# Altium integrated library PAT_Library.IntLib: 45 symbols (part 1 of 2)
Pins are listed as number, name and electrical type; pins without a type are passive.

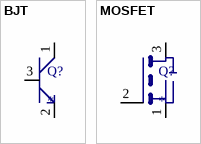
[diagram p0: symbols BJT to MOSFET]

## BJT
designator Q?
Transistor BJT; Digi-Key Part Number: MMBT2222A-FDICT-ND
footprint BJT
pins: 1, 2, 3

## MOSFET
designator Q?
Transistor FET; Digi-Key Part Number: BSS123NCT-ND
footprint MOSFET
pins: 1 G, 2 S, 3 D


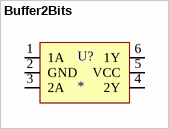
[diagram p1: symbol Buffer2Bits]

## Buffer2Bits
designator U?
Buffer 2Bits; Digi-Key Part Number: *
footprint DCK R_PDSO-G6
pins: 1 1A, 2 GND, 3 2A, 4 2Y, 5 VCC, 6 1Y


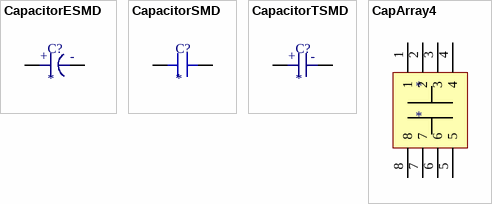
[diagram p2: symbols CapacitorESMD to CapArray4]

## CapacitorESMD
designator C?
Electrolitic Capacitor
footprint CAPACITORE0805
footprint CAPACITORE1206
footprint RadialSMD6.3 (SMD Type Radial)
footprint RADIALSMD4.0
pins: 1, 2
text: +; -

## CapacitorSMD
designator C?
Ceramic Capacitor
footprint Capacitor1206
footprint Capacitor0805
pins: 1, 2

## CapacitorTSMD
designator C?
Tantalum Capacitor; Digi-Key PArt Number: *
footprint CAPACITORT1210 (Tantalum Capacitor 1210)
pins: 1, 2
text: +; -

## CapArray4
designator *
Capacitor Network, 4 Isolated
footprint C_array
pins: 1, 2, 3, 4, 5, 6, 7, 8


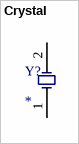
[diagram p3: symbol Crystal]

## Crystal
designator Y?
Crystal SMD
footprint CrystalSMD
footprint CRYSTALSMDMini
footprint CRYSTALTHR (Crystal Thru - Hole)
pins: 1, 2


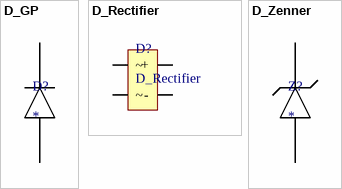
[diagram p4: symbols D_GP to D_Zenner]

## D_GP
designator D?
Single Diode Rectifier SMD
footprint SMA (Diode SMA)
footprint DIODO
footprint SMB (Diode SMB)
footprint SOD80
pins: 1, 2

## D_Rectifier
designator D?
Full bridge Rectifier; Digi-Key Part Number: DF04SCT-ND
footprint SDIP4
pins: 1 +, 2 -, 3 ~, 4 ~

## D_Zenner
designator Z?
Diode Zenner Type SMB
footprint SMB
footprint SOD123
pins: 1, 2


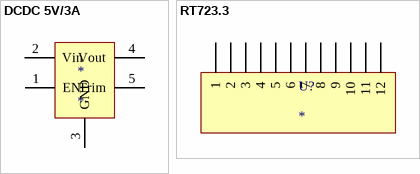
[diagram p5: symbols DCDC 5V/3A to RT723.3]

## DCDC 5V/3A
designator *
footprint OKR
pins: 1 EN, 2 Vin, 3 GND, 4 Vout, 5 Trim

## RT723.3
designator U?
Conversor DC/DC salida 3.3V
footprint R-723.3P
pins: 1, 2, 3, 4, 5, 6, 7, 8, 9, 10, 11, 12


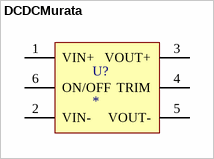
[diagram p6: symbol DCDCMurata]

## DCDCMurata
designator U?
Converter DC-DC Murata, high current; Digi-Key Part Number: 811-3139-1-ND
footprint DCDCMurata
pins: 1 VIN+, 2 VIN-, 3 VOUT+, 4 TRIM, 5 VOUT-, 6 ON/OFF


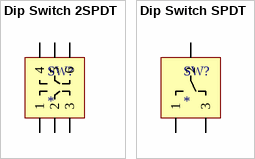
[diagram p7: symbols Dip Switch 2SPDT to Dip Switch SPDT]

## Dip Switch 2SPDT
designator SW?
Two SPDT switch; Digi-Key Part Number: CASD20GCT-ND
footprint DIPSWITCH2SPDT
pins: 1, 2, 3, 4, 5, 6

## Dip Switch SPDT
designator SW?
One SPDT switch; Digi-Key Part Number: 563-1024-1-ND
footprint DipSwitchSPDT
pins: 1, 2, 3


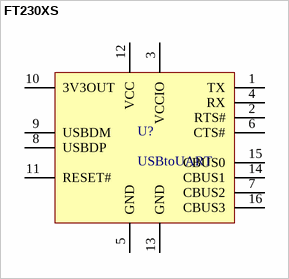
[diagram p8: symbol FT230XS]

## FT230XS
designator U?, comment USBtoUART
FTDI USB Serial Converter
footprint SSOP16
pins: 1 TX, 2 RTS#, 3 VCCIO, 4 RX, 5 GND, 6 CTS#, 7 CBUS2, 8 USBDP, 9 USBDM, 10 3V3OUT, 11 RESET#, 12 VCC, 13 GND, 14 CBUS1, 15 CBUS0, 16 CBUS3


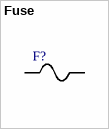
[diagram p9: symbol Fuse]

## Fuse
designator F?  (value not drawn)
Fuse 6x25mm; Digi-Key Part Number: 283-2601-ND; Digi-Key Part Number: 283-3410-ND
footprint FH_25mm (Para Fuse de 25mm y diam 6mm)
footprint FUSEBLOCKSMD (Fuse Block Cartridge SMD)
pins: 1, 2


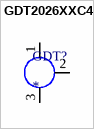
[diagram p10: symbol GDT2026XXC4]

## GDT2026XXC4
designator GDT?
Digi-Key Part Number: 2026-07-C4-ND
footprint GDT2026XXC4
pins: 1, 2, 3


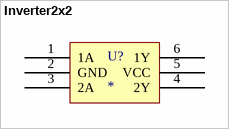
[diagram p11: symbol Inverter2x2]

## Inverter2x2
designator U?
Logic Inverter 2 Circuits; Digi-Key Part Number: 296-27361-1-ND
footprint Inverter2x2 (Inversor Lógico 2E2S)
pins: 1 1A, 2 GND, 3 2A, 4 2Y, 5 VCC, 6 1Y


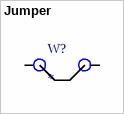
[diagram p12: symbol Jumper]

## Jumper
designator W?
Jumper
footprint Jumper
pins: 1, 2


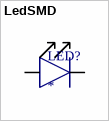
[diagram p13: symbol LedSMD]

## LedSMD
designator LED?
Discrete Led SMD 1205 Green; Digi-Key Part Number: 160-1169-1-ND
footprint SMD1206
pins: 1, 2


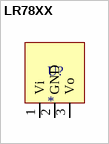
[diagram p14: symbol LR78XX]

## LR78XX
designator U?
Linear Regulator 78XX; Digi-Key Part Number: 497-1203-1-ND
footprint LR78XX (SMD)
footprint SOT223
pins: 1 Vi, 2 GND, 3 Vo


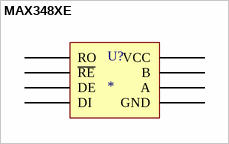
[diagram p15: symbol MAX348XE]

## MAX348XE
designator U?
Digi-Key Part Number: MAX3485ECSA+-ND
footprint MAX348XE
pins: 1 RO, 2 ~{RE}, 3 DE, 4 DI, 5 GND, 6 A, 7 B, 8 VCC


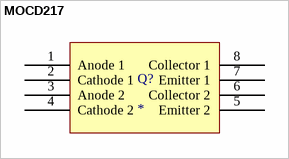
[diagram p16: symbol MOCD217]

## MOCD217
designator Q?
Optocoupler; Digi-Key Part Number: MOCD217R2MCT-ND
footprint SOIC8
pins: 1 Anode 1, 2 Cathode 1, 3 Anode 2, 4 Cathode 2, 5 Emitter 2, 6 Collector 2, 7 Emitter 1, 8 Collector 1


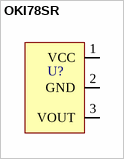
[diagram p17: symbol OKI78SR]

## OKI78SR
designator U?  (value not drawn)
Regulator DC-DC 3.3V 1.5A; Digi-Key Part Number: 811-2196-5-ND
footprint OKI78SR (Regulator DC-DC 3.3V 1.5A)
footprint OKI78SRE (DC-DC Converter Right-Angle)
pins: 1 VCC, 2 GND, 3 VOUT


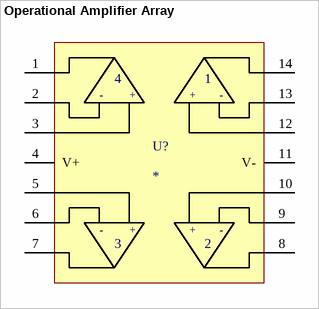
[diagram p18: symbol Operational Amplifier Array]

## Operational Amplifier Array
designator U?
Array Opam; Digi-Key Part Number: LMC660CMX/NOPBCT-ND
footprint Opam Array (Four Opam)
pins: 1, 2, 3, 4 V+, 5, 6, 7, 8, 9, 10, 11 V-, 12, 13, 14
text: -; +


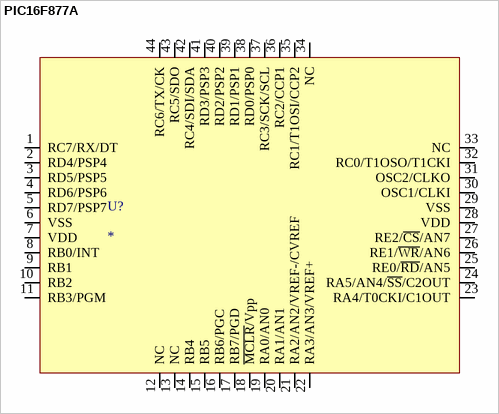
[diagram p19: symbol PIC16F877A]

## PIC16F877A
designator U?
Microcontroller PIC16F877A TQFP; Digi-Key Part Number: PIC16F877AT-I/PTCT-ND
footprint PIC16F877A (44Pin-TQFP)
pins: 1 RC7/RX/DT, 2 RD4/PSP4, 3 RD5/PSP5, 4 RD6/PSP6, 5 RD7/PSP7, 6 VSS, 7 VDD, 8 RB0/INT, 9 RB1, 10 RB2, 11 RB3/PGM, 12 NC, 13 NC, 14 RB4, 15 RB5, 16 RB6/PGC, 17 RB7/PGD, 18 ~{MCLR}/Vpp, 19 RA0/AN0, 20 RA1/AN1, 21 RA2/AN2/VREF-/CVREF, 22 RA3/AN3/VREF+, 23 RA4/T0CKI/C1OUT, 24 RA5/AN4/~{SS}/C2OUT, 25 RE0/~{RD}/AN5, 26 RE1/~{WR}/AN6, 27 RE2/~{CS}/AN7, 28 VDD, 29 VSS, 30 OSC1/CLKI, 31 OSC2/CLKO, 32 RC0/T1OSO/T1CKI, 33 NC, 34 NC, 35 RC1/T1OSI/CCP2, 36 RC2/CCP1, 37 RC3/SCK/SCL, 38 RD0/PSP0, 39 RD1/PSP1, 40 RD2/PSP2, 41 RD3/PSP3, 42 RC4/SDI/SDA, 43 RC5/SDO, 44 RC6/TX/CK


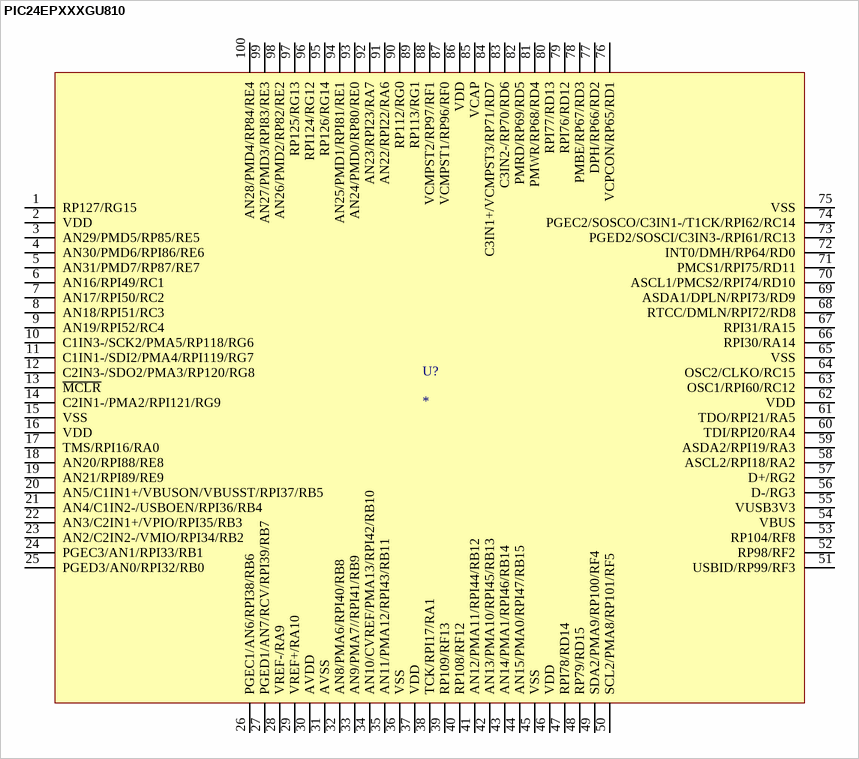
[diagram p20: symbol PIC24EPXXXGU810]

## PIC24EPXXXGU810
designator U?
Microcontroller MicroChip PIC24EP; Digi-Key Part Number: PIC24EP256GU810-I/PT-ND
footprint QFP100 (Microcontroller 12x12x1mm body, 2mm footprint)
pins: 1 RP127/RG15, 2 VDD, 3 AN29/PMD5/RP85/RE5, 4 AN30/PMD6/RPI86/RE6, 5 AN31/PMD7/RP87/RE7, 6 AN16/RPI49/RC1, 7 AN17/RPI50/RC2, 8 AN18/RPI51/RC3, 9 AN19/RPI52/RC4, 10 C1IN3-/SCK2/PMA5/RP118/RG6, 11 C1IN1-/SDI2/PMA4/RPI119/RG7, 12 C2IN3-/SDO2/PMA3/RP120/RG8, 13 ~{MCLR}, 14 C2IN1-/PMA2/RPI121/RG9, 15 VSS, 16 VDD, 17 TMS/RPI16/RA0, 18 AN20/RPI88/RE8, 19 AN21/RPI89/RE9, 20 AN5/C1IN1+/VBUSON/VBUSST/RPI37/RB5, 21 AN4/C1IN2-/USBOEN/RPI36/RB4, 22 AN3/C2IN1+/VPIO/RPI35/RB3, 23 AN2/C2IN2-/VMIO/RPI34/RB2, 24 PGEC3/AN1/RPI33/RB1, 25 PGED3/AN0/RPI32/RB0, 26 PGEC1/AN6/RPI38/RB6, 27 PGED1/AN7/RCV/RPI39/RB7, 28 VREF-/RA9, 29 VREF+/RA10, 30 AVDD, 31 AVSS, 32 AN8/PMA6/RPI40/RB8, 33 AN9/PMA7//RPI41/RB9, 34 AN10/CVREF/PMA13/RPI42/RB10, 35 AN11/PMA12/RPI43/RB11, 36 VSS, 37 VDD, 38 TCK/RPI17/RA1, 39 RP109/RF13, 40 RP108/RF12, 41 AN12/PMA11/RPI44/RB12, 42 AN13/PMA10/RPI45/RB13, 43 AN14/PMA1/RPI46/RB14, 44 AN15/PMA0/RPI47/RB15, 45 VSS, 46 VDD, 47 RPI78/RD14, 48 RP79/RD15, 49 SDA2/PMA9/RP100/RF4, 50 SCL2/PMA8/RP101/RF5, 51 USBID/RP99/RF3, 52 RP98/RF2, 53 RP104/RF8, 54 VBUS, 55 VUSB3V3, 56 D-/RG3, 57 D+/RG2, 58 ASCL2/RPI18/RA2, 59 ASDA2/RPI19/RA3, 60 TDI/RPI20/RA4, 61 TDO/RPI21/RA5, 62 VDD, 63 OSC1/RPI60/RC12, 64 OSC2/CLKO/RC15, 65 VSS, 66 RPI30/RA14, 67 RPI31/RA15, 68 RTCC/DMLN/RPI72/RD8, 69 ASDA1/DPLN/RPI73/RD9, 70 ASCL1/PMCS2/RPI74/RD10, 71 PMCS1/RPI75/RD11, 72 INT0/DMH/RP64/RD0, 73 PGED2/SOSCI/C3IN3-/RPI61/RC13, 74 PGEC2/SOSCO/C3IN1-/T1CK/RPI62/RC14, 75 VSS, 76 VCPCON/RP65/RD1, 77 DPH/RP66/RD2, 78 PMBE/RP67/RD3, 79 RPI76/RD12, 80 RPI77/RD13, 81 PMWR/RP68/RD4, 82 PMRD/RP69/RD5, 83 C3IN2-/RP70/RD6, 84 C3IN1+/VCMPST3/RP71/RD7, 85 VCAP, 86 VDD, 87 VCMPST1/RP96/RF0, 88 VCMPST2/RP97/RF1, 89 RP113/RG1, 90 RP112/RG0, 91 AN22/RPI22/RA6, 92 AN23/RPI23/RA7, 93 AN24/PMD0/RP80/RE0, 94 AN25/PMD1/RPI81/RE1, 95 RP126/RG14, 96 RPI124/RG12, 97 RP125/RG13, 98 AN26/PMD2/RP82/RE2, 99 AN27/PMD3/RPI83/RE3, 100 AN28/PMD4/RP84/RE4


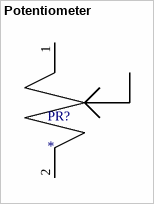
[diagram p21: symbol Potentiometer]

## Potentiometer
designator PR?
Variable resistance
footprint Potentiometer (Thruhole mounting)
footprint T63YB
pins: 1, 2


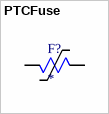
[diagram p22: symbol PTCFuse]

## PTCFuse
designator F?
Resetteable PTC Fuses; Digi-Key Part Number: RHEF070-2HFCT-ND
footprint PTCFuse (Ressettable Fuse)
footprint PTCFUSE2 (Resettable Fuse Version 2)
pins: 1, 2
